# Altium footprint library ACTION标准库.pcblib: 504 footprints (part 30 of 32)
Each footprint in its own frame and in the unit in brackets; x right, y up, seen from the top. Pads: shape width x height; smd on the part's side, far side on the other; paste and mask are expansions set on the pad; w line width, h text height; cw(c..) or ccw(c..) is an arc to the next point about the centre after c.
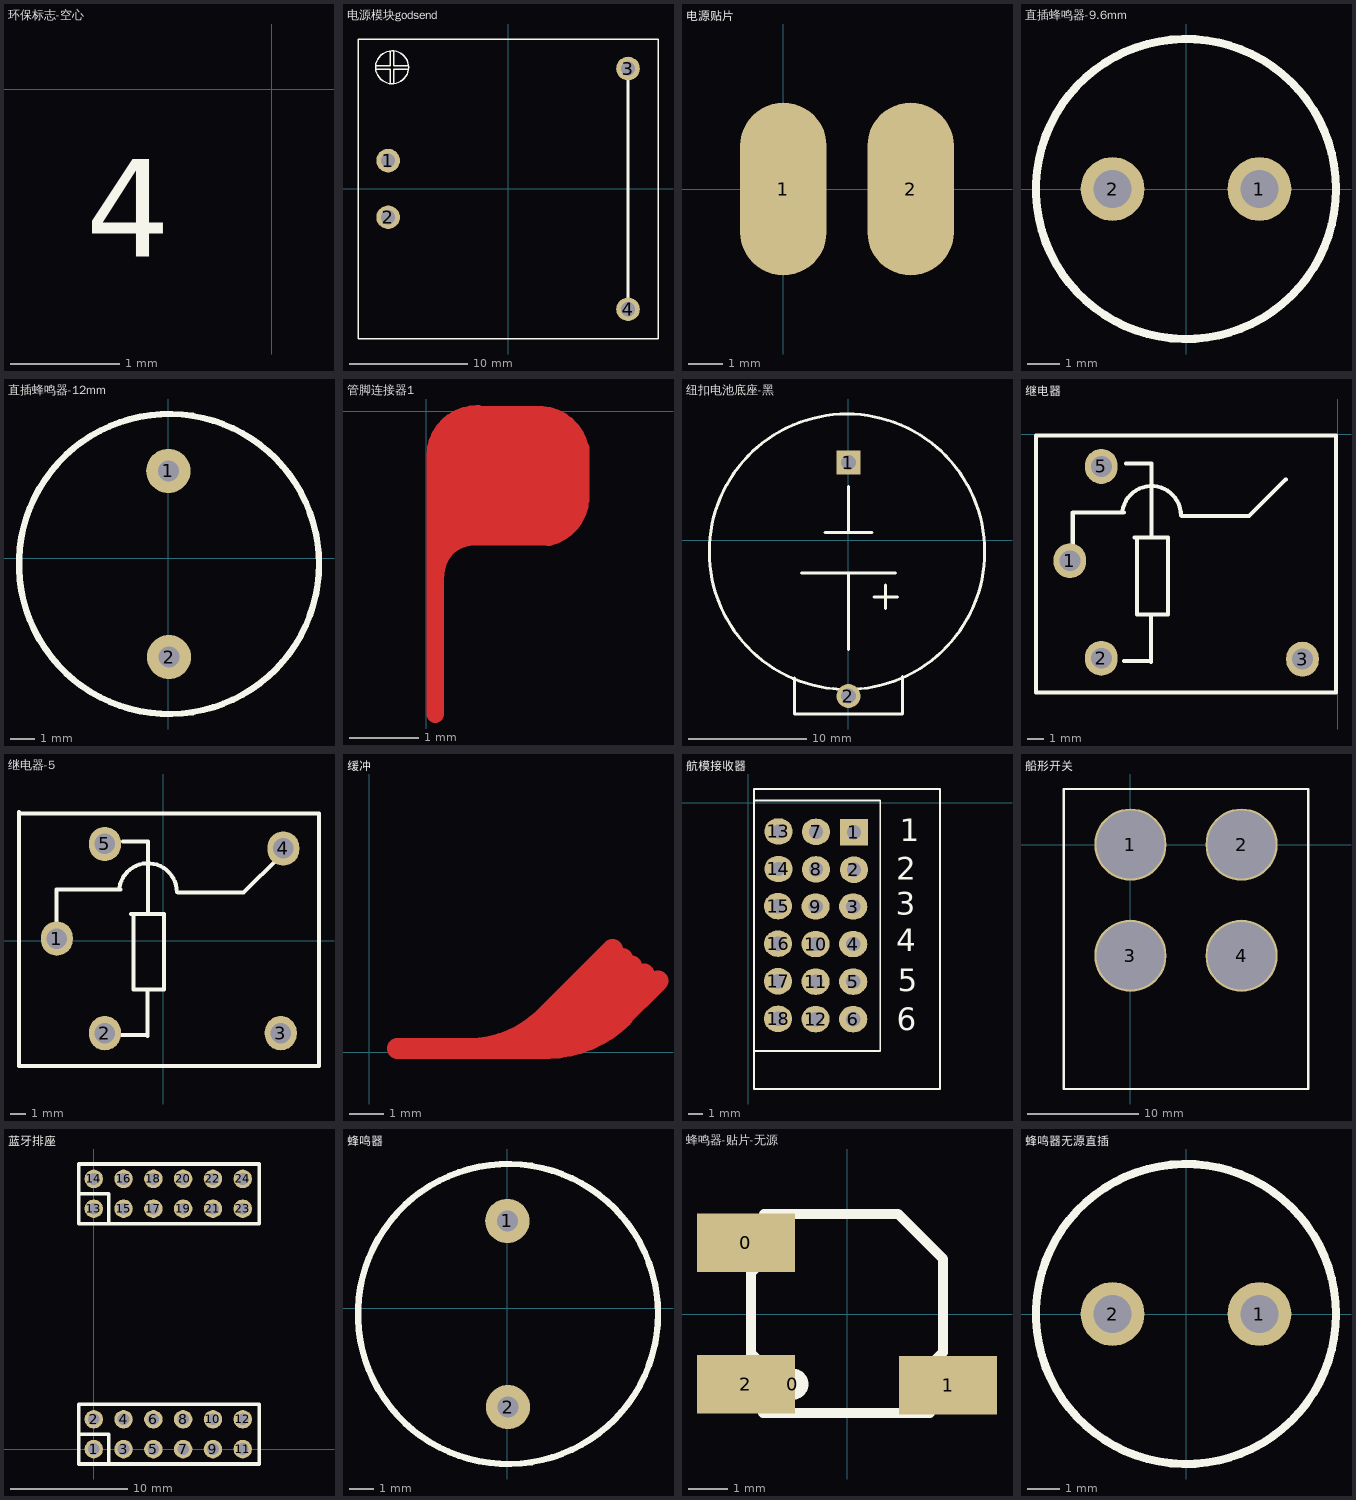
[diagram p29: the footprints below, top view; thin cyan lines are the x and y axes]

## 环保标志-空心 [mm]
Top Overlay:
  text "4" at -1.702,-1.829 h1.52

## 电源模块godsend [mm]
pads (4):
  round 2 hole 1.2: 1(-10.16,2.4) 2(-10.16,-2.4) 3(10.16,10.198) 4(10.16,-10.198)
Top Overlay:
  circle w0.127: c-9.822,10.302 r1.4
  lines w0.127: -11.214,10.152 -9.972,10.152 -9.972,8.91 ; -11.214,10.452 -9.972,10.452 -9.972,11.694 ; -9.672,8.91 -9.672,10.152 -8.43,10.152 ; -9.672,11.694 -9.672,10.452 -8.43,10.452 ; -12.713,-12.703 12.7,-12.703 12.7,12.687 -12.713,12.687 -12.713,-12.703
  lines w0.254: 10.16,-10.202 10.16,10.198

## 电源贴片 [mm]
pads (2):
  oval 2.5x5 smd: 1(0,0) 2(3.683,0)

## 直插蜂鸣器-9.6mm [mm]
pads (2):
  round 2 hole 1.2: 1(2.3,0) 2(-2.3,0)
Top Overlay:
  circle w0.254: c0,0 r4.7
3D body "BUZZER-短引脚9.6MM.stp": height 5.5, standoff -5, extent -4.8,-4.774 4.8,4.826

## 直插蜂鸣器-12mm [mil]
pads (2):
  round 70 hole 33.46: 1(0,138) 2(1,-156)
Top Overlay:
  circle w10: c1,-9 r237
3D body "蜂鸣器修改.STEP": height 362.2, standoff -78.74, extent -232.59,-244.71 240.46,228.35

## 管脚连接器1 [mm]
Top Layer:
  lines w0.254: 0.127,-4.343 0.127,-0.641 ; 0.128,-0.634 cw(c0.727,-0.641) 0.737,-0.042 ; 0.136,-2.34 cw(c0.679,-2.346) 0.688,-1.803 ; 0.203,-1.727 1.88,-1.727 ; 0.203,-1.524 2.083,-1.524 ; 0.203,-0.864 2.083,-0.864 ; 0.229,-1.321 2.108,-1.321 ; 0.229,-1.092 2.108,-1.092 ; 0.229,-0.686 2.108,-0.686 ; 0.254,-0.483 2.134,-0.483 ; 0.356,-0.254 2.007,-0.254 ; 0.66,-0.051 1.651,-0.051 cw(c1.616,-0.649) 2.215,-0.643 ; 0.679,-1.803 1.676,-1.803 ; 1.757,-1.808 ccw(c1.612,-1.226) 2.21,-1.27 2.21,-0.533

## 纽扣电池底座-黑 [mil] "CR2032电池座（未加焊）"
pads (2):
  rect 80x80 hole 50: 1(0.21,260.42)
  round 80 hole 50: 2(0.21,-519.58)
Top Overlay:
  circle w10: c-4.79,-37.58 r460
  lines w10: -179.79,-459.58 -179.79,-579.58 180.21,-579.58 180.21,-453.58 ; -156.79,-108.58 157.21,-108.58 ; -77.79,27.34 78.21,27.34 ; 0.21,-364.58 0.21,-108.58 ; 0.21,28.73 0.21,180.42 ; 85.43,-188.34 164.43,-188.34 ; 124.43,-227.34 124.43,-148.34
3D body "bat_n.stp": height 301.57, standoff -181.11, extent -435.69,-565.55 435.69,385.94

## 继电器 [mm]
pads (4):
  oval 2.033x2.179 hole 1.3: 1(-16.665,-7.872) 2(-14.709,-13.943) 3(-2.187,-13.998) 5(-14.709,-2.005)
Top Overlay:
  lines w0.254: -16.487,-6.958 -16.487,-4.875 -13.541,-4.875 -13.312,-4.875 ; -13.397,-4.788 cw(c-11.585,-5.053) -9.753,-5.053 ; -13.287,-14.121 -11.661,-14.121 -11.61,-14.172 -11.61,-11.276 ; -13.16,-1.827 -11.585,-1.827 -11.585,-6.323 ; -12.652,-6.425 -10.569,-6.425 -10.569,-11.225 -12.499,-11.225 -12.499,-6.475 ; -9.68,-5.078 -5.514,-5.078 -3.254,-2.818 -3.203,-2.818 ; -18.773,-16.077 -18.773,-0.075 -0.104,-0.075 -0.104,-16.077 -18.773,-16.077

## 继电器-5 [mm]
pads (5):
  oval 2.033x2.179 hole 1.3: 1(-6.744,0.128) 2(-3.699,-5.872) 3(7.456,-5.872) 4(7.62,5.842) 5(-3.699,6.128)
Top Overlay:
  lines w0.254: -9.144,8.052 9.881,8.052 9.881,-7.95 -9.144,-7.95 -9.144,8.153 ; -6.756,1.168 -6.756,3.251 -2.921,3.251 -2.692,3.251 ; -2.778,3.339 cw(c-0.965,3.073) 0.866,3.073 ; -2.667,-5.994 -1.041,-5.994 -0.991,-6.045 -0.991,-3.15 ; -2.54,6.299 -0.965,6.299 -0.965,1.803 ; -2.032,1.702 0.051,1.702 0.051,-3.099 -1.88,-3.099 -1.88,1.651 ; 0.94,3.048 5.105,3.048 7.366,5.309 7.417,5.309

## 缓冲 [mm]
Top Layer:
  lines w0.6: 0.813,0.109 2.235,0.109 2.979,0.109 5.182,0.109 ; 2.918,0.104 ccw(c2.855,3.283) 5.104,1.034 7.052,2.983 ; 5.053,0.425 7.343,2.715 ; 5.182,0.102 ccw(c5.119,3.281) 7.367,1.032 ; 5.662,0.552 7.611,2.5 ; 6.018,0.323 7.966,2.272 ; 7.237,0.933 8.372,2.067

## 航模接收器 [mil]
pads (18):
  rect 75x70 hole 38: 1(282,-78)
  oval 75x70 hole 38: 2(282,-178) 3(280,-276) 4(280,-376) 5(280,-476) 6(280,-576) 7(181,-77) 8(181,-177) 9(180,-276) 10(180,-376) 11(180,-476) 12(180,-576) 13(81,-76) 14(81,-176) 15(80,-275) 16(80,-375) 17(80,-475) 18(80,-575)
Top Overlay:
  lines w5: 16,-18 16,37 511,37 511,-17 511,-762 16,-762 16,-661 ; 16,-661 352,-661 352,6 16,6 16,-661
  text "6" at 396,-605 h60
  text "5" at 398,-501 h60
  text "4" at 395,-395 h60
  text "3" at 394,-298 h60
  text "2" at 395,-205 h60
  text "1" at 404,-102 h60

## 船形开关 [mm]
pads (4):
  round 6.5 hole 6.1: 1(0,0) 2(10,0) 3(0,-10) 4(10,-10)
Top Overlay:
  lines w0.198: -6,-22 16,-22 16,5 -6,5 -6,-22

## 蓝牙排座 [mil]
pads (24):
  round 62 hole 39.37: 1(0,0) 2(0,100) 3(100,0) 4(100,100) 5(200,0) 6(200,100) 7(300,0) 8(300,100) 9(400,0) 10(400,100) 11(500,0) 12(500,100) 13(0,807.09) 14(0,907.09) 15(100,807.09) 16(100,907.09) 17(200,807.09) 18(200,907.09) 19(300,807.09) 20(300,907.09) 21(400,807.09) 22(400,907.09) 23(500,807.09) 24(500,907.09)
Top Overlay:
  lines w12: -50,50 50,50 50,-50 ; -50,857.09 50,857.09 50,757.09 ; -50,-50 -50,150 555,150 555,-50 -50,-50 ; -50,757.09 555,757.09 555,957.09 -50,957.09 -50,757.09

## 蜂鸣器 [mil]
pads (2):
  round 70 hole 33.46: 1(0,138) 2(1,-156)
Top Overlay:
  circle w10: c1,-9 r237
3D body "蜂鸣器修改.STEP": height 362.2, standoff -78.74, extent -232.59,-244.71 240.46,228.35

## 蜂鸣器-贴片-无源 [mm]
pads (4):
  rect 2.5x1.5 smd: 0(-2.578,1.816) 1(2.578,-1.816) 2(-2.578,-1.791)
  round 0.8 on Top Overlay: 0(-1.384,-1.791)
Top Overlay:
  lines w0.254: -2.451,-1.029 -2.451,1.054 -2.121,1.384 ; -2.451,-1.003 -2.146,-1.308 ; -2.146,-1.359 -2.146,-2.527 2.121,-2.527 2.121,-1.308 2.451,-0.978 2.451,1.105 ; -2.121,1.41 -2.121,2.553 1.308,2.553 2.451,1.41 2.451,1.206 ; 2.451,1.13 2.451,1.232

## 蜂鸣器无源直插 [mm]
pads (2):
  round 2 hole 1.2: 1(2.3,0) 2(-2.3,0)
Top Overlay:
  circle w0.254: c0,0 r4.7